# Altium footprint library ICL_passives_v1.PcbLib: 102 footprints (part 7 of 7)
Each footprint in its own frame and in the unit in brackets; x right, y up, seen from the top. Pads: shape width x height; smd on the part's side, far side on the other; paste and mask are expansions set on the pad; w line width, h text height; cw(c..) or ccw(c..) is an arc to the next point about the centre after c.
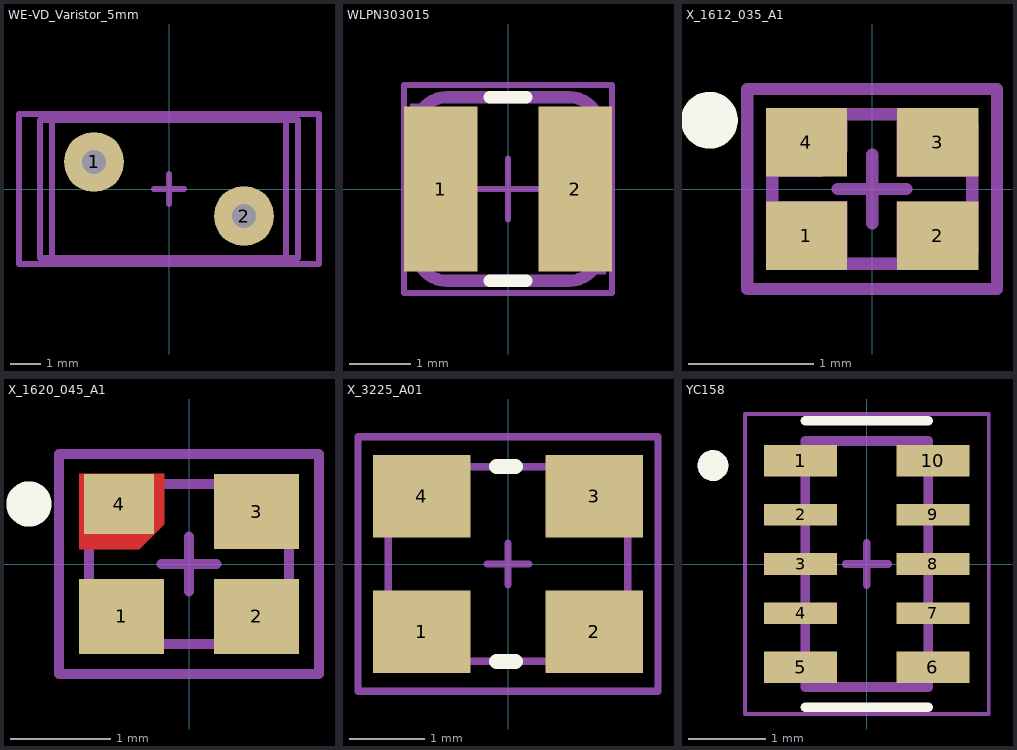
[diagram p6: the footprints below, top view; thin cyan lines are the x and y axes]

## WE-VD_Varistor_5mm [mm] "WE-VD Disk Varistor 5mm"
pads (2):
  round 2 hole 0.8 unplated: 1(-2.5,0.9) 2(2.5,-0.9)
Top M17-18_TDES:
  text "'.Designator'" at -3.765,0.983 h1
Top M19-20_TMOT:
  lines w0.2: -4.3,-2.3 4.306,-2.3 ; -4.3,-2.285 -4.3,2.3 4.306,2.3 4.306,-2.285 ; -3.9,-2.285 -3.9,2.3 ; 3.906,-2.285 3.906,2.3 ; -3,0.4 -3,1.4 -2,1.4 -2,0.4 -3,0.4 ; 2,-1.4 3,-1.4 3,-0.4 2,-0.4 2,-1.4
Top M25-26_TORG:
  lines w0.2: -0.5,0 0,0 ; 0,-0.5 0,0 ; 0,0.5 0,0 ; 0.5,0 0,0 ; -5,-2.5 5,-2.5 5,2.5 -5,2.5 -5,-2.5
3D body "WE-VD_5_mm_short.STEP": height 10.74, standoff -1.75, extent -3.745,-1.926 3.741,1.926

## WLPN303015 [mm]
pads (2):
  rect 1.2x2.7 smd mask+0: 1(-1.1,0) 2(1.1,0)
Top Overlay:
  lines w0.2: -0.3,-1.5 0.3,-1.5 ; -0.3,1.5 0.3,1.5
Top M11-12_SMOT:
  region: -1.4,1.4 -1.6,1.4 -1.6,-1.3 -1.4,-1.3
  rectangle: 1.4,-1.4 1.6,1.3
  lines w0.1: -1.5,-1 -1.5,1 ; 1.5,-1 1.5,1
  lines w0.2: -1.5,-1 ccw(c-1,-1) -1,-1.5 1,-1.5 ccw(c1,-1) 1.5,-1 ; -1.5,1 cw(c-1,1) -1,1.5 1,1.5 cw(c1,1) 1.5,1
Top M13-14_SDES:
  text "'.Designator'" at 0.333,-4.532 h0.8
Top M15-16_SORG:
  lines w0.1: -0.5,0 0.5,0 ; 0,-0.5 0,0.5 ; -1.7,-1.7 1.7,-1.7 1.7,1.7 -1.7,1.7 -1.7,-1.7
3D body: height 0.3, standoff 0, extent -1.6,-1.3 -1.4,1.3
3D body: height 0.3, standoff 0, extent 1.4,-1.3 1.6,1.3
3D body: height 1.5, standoff 0, extent -1.5,-1.5 1.5,1.5

## X_1612_035_A1 [mm] "ECS 1.6x1.2mm"
height 0.37
pads (4):
  rect 0.65x0.55 smd: 1(-0.525,-0.375) 2(0.525,-0.375) 3(0.525,0.375) 4(-0.525,0.375)
Top Overlay:
  circle w0.254: c-1.3,0.55 r0.1
Top M11-12_SMOT:
  region: -0.7,0.6 -0.2,0.6 -0.2,0.3 -0.4,0.1 -0.8,0.1 -0.8,0.5
  region: 0.663,0.6 0.8,0.463 0.8,0.1 0.2,0.1 0.2,0.6
  region: -0.7,-0.6 -0.8,-0.5 -0.8,-0.1 -0.2,-0.1 -0.2,-0.6
  region: 0.8,-0.5 0.68,-0.6 0.2,-0.6 0.2,-0.1 0.8,-0.1
  lines w0.1: -0.8,-0.5 cw(c-0.8,-0.6) -0.7,-0.6 0.7,-0.6 cw(c0.8,-0.6) 0.8,-0.5 0.8,0.5 cw(c0.8,0.6) 0.7,0.6 -0.7,0.6 cw(c-0.8,0.6) -0.8,0.5 -0.8,-0.5
Top M13-14_SDES:
  text "'.Designator'" at -2.366,0.933 h0.4
Top M15-16_SORG:
  lines w0.1: -0.275,0 0.275,0 ; 0,-0.275 0,0.275 ; -1,-0.8 1,-0.8 1,0.8 -1,0.8 -1,-0.8
3D body "User Library-NX1612SA.step": height 0.31, standoff 0.01, extent -0.8,-0.6 0.8,0.6

## X_1620_045_A1 [mm] "NX2016"
height 0.37
pads (4):
  rect 0.85x0.75 smd: 1(-0.675,-0.525) 2(0.675,-0.525) 3(0.675,0.525)
  rect 0.7x0.6 smd paste+0 mask-0.7: 4(-0.7,0.6)
Top Layer:
  region: -1.1,0.9 -0.25,0.9 -0.25,0.4 -0.5,0.15 -1.1,0.15
Top Overlay:
  circle w0.254: c-1.6,0.6 r0.1
Top M11-12_SMOT:
  region: 0.9,-0.8 0.3,-0.8 0.3,-0.2 1,-0.2 1,-0.7
  region: -1,-0.7 -1,-0.2 -0.3,-0.2 -0.3,-0.8 -0.9,-0.8
  region: 1,0.7 1,0.2 0.3,0.2 0.3,0.8 0.9,0.8
  region: -0.9,0.8 -0.3,0.8 -0.3,0.5 -0.6,0.2 -1,0.2 -1,0.7
  lines w0.1: -1,-0.7 cw(c-1,-0.8) -0.9,-0.8 0.9,-0.8 cw(c1,-0.8) 1,-0.7 1,0.7 cw(c1,0.8) 0.9,0.8 -0.9,0.8 cw(c-1,0.8) -1,0.7 -1,-0.7
Top M13-14_SDES:
  text "'.Designator'" at -2.266,-0.167 h0.4
Top M15-16_SORG:
  lines w0.1: -0.275,0 0.275,0 ; 0,-0.275 0,0.275 ; -1.3,-1.1 -1.3,1.1 1.3,1.1 1.3,-1.1 -1.3,-1.1
3D body "NX2016SA.step": height 0.47, standoff 0, extent -1,-0.8 1,0.8

## X_3225_A01 [mm] "xtal 3225"
height 0.37
pads (4):
  rect 1.3x1.1 smd: 1(-1.15,-0.9) 2(1.15,-0.9) 3(1.15,0.9) 4(-1.15,0.9)
Top Overlay:
  lines w0.2: -0.15,-1.3 0.1,-1.3 ; -0.15,1.3 0.1,1.3
Top M11-12_SMOT:
  lines w0.1: -1.6,-1.3 -1.6,1.3 1.6,1.3 1.6,-1.3 -1.6,-1.3
Top M13-14_SDES:
  text "'.Designator'" at -2.266,-0.167 h0.4
Top M15-16_SORG:
  lines w0.1: -0.275,0 0.275,0 ; 0,-0.275 0,0.275 ; -2,-1.7 -2,1.7 2,1.7 2,-1.7 -2,-1.7
3D body "Oscillator_ECS-3225S.STEP": height 0.93, standoff 0.01, extent -1.6,-1.25 1.6,1.25

## YC158 [mm] "8 resistors one pack"
pads (10):
  rect 0.95x0.41 smd: 1(-0.86,1.345) 5(-0.86,-1.345) 6(0.86,-1.345) 10(0.86,1.345)
  rect 0.95x0.28 smd: 2(-0.86,0.64) 3(-0.86,0) 4(-0.86,-0.64) 7(0.86,-0.64) 8(0.86,0) 9(0.86,0.64)
Top Overlay:
  circle w0.2: c-2,1.28 r0.1
  lines w0.127: -0.8,-1.863 0.8,-1.863 ; -0.8,1.863 0.8,1.863
Top M11-12_SMOT:
  lines w0.127: -0.8,-1.6 0.8,-1.6 0.8,1.6 -0.8,1.6 -0.8,-1.6
Top M13-14_SDES:
  circle w0.2: c-2,1.28 r0.1
  text "'.Designator'" at -2.266,2.033 h0.4
Top M15-16_SORG:
  lines w0.05: -1.585,-1.95 1.585,-1.95 1.585,1.95 -1.585,1.95 -1.585,-1.95
  lines w0.1: -0.275,0 0.275,0 ; 0,-0.275 0,0.275
3D body "step_temp.STEP": height 0.7, standoff 0, extent -0.8,-1.6 0.8,1.6